# Altium footprint library Zmod.PcbLib: 229 footprints (part 10 of 15)
Each footprint in its own frame and in the unit in brackets; x right, y up, seen from the top. Pads: shape width x height; smd on the part's side, far side on the other; paste and mask are expansions set on the pad; w line width, h text height; cw(c..) or ccw(c..) is an arc to the next point about the centre after c.
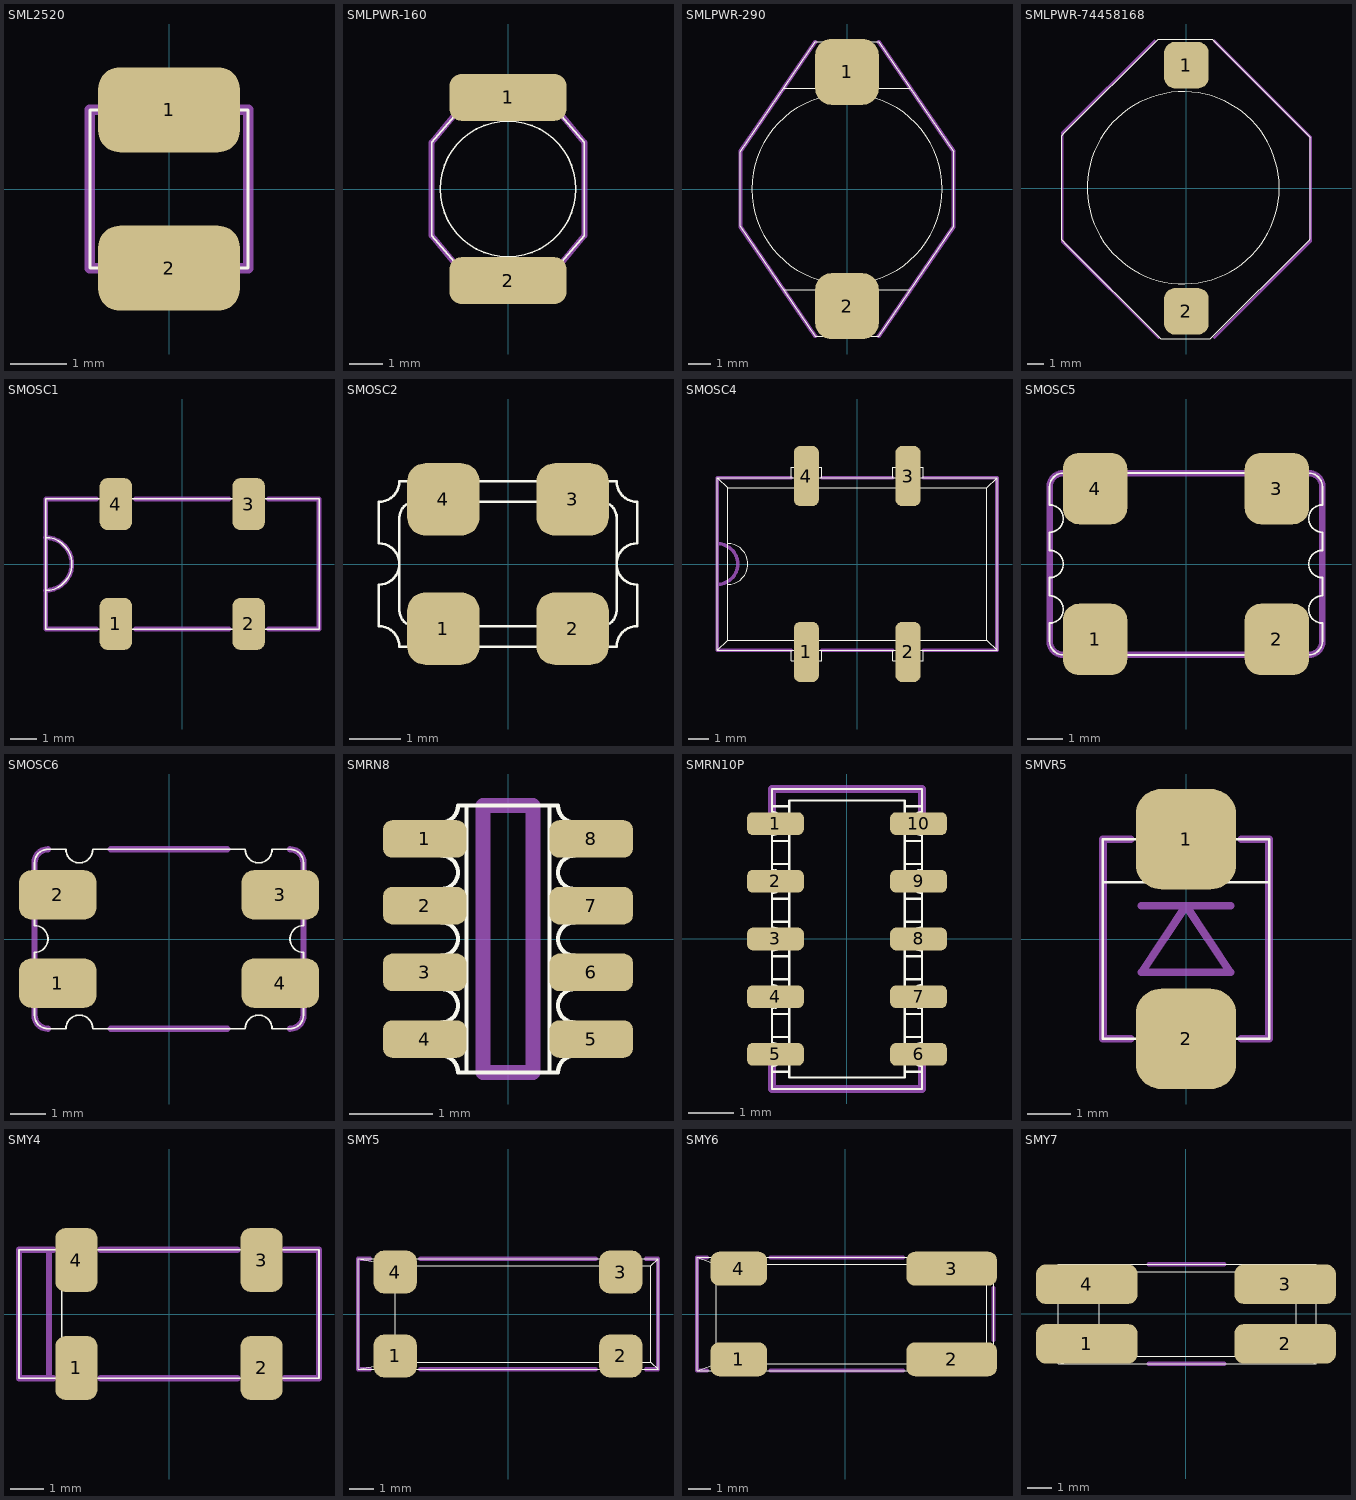
[diagram p9: the footprints below, top view; thin cyan lines are the x and y axes]

## SML2520 [mm]
height 2.032
pads (2):
  rrect50% 2.5x1.5 smd: 1(0,1.397) 2(0,-1.397)
Top Overlay:
  lines w0.05: -1.397,-1.397 1.397,-1.397 1.397,1.397 -1.397,1.397 -1.397,-1.397
Mechanical 15:
  lines w0.18: -1.27,-1.397 -1.397,-1.397 -1.397,1.397 -1.27,1.397 ; 1.27,-1.397 1.397,-1.397 1.397,1.397 1.27,1.397
  text ".Designator" at 0.635,-2.032 h1.5

## SMLPWR-160 [mm]
height 2.921
pads (2):
  rrect50% 3.5x1.4 smd: 1(0,2.743) 2(0,-2.743)
Top Overlay:
  circle w0.05: c0,0 r2.032
  circle w0.05: c0,0 r2.032
  lines w0.05: -1.524,-2.286 1.524,-2.286 ; -1.524,2.286 1.524,2.286 ; -2.286,-1.397 -0.635,-3.302 0.635,-3.302 2.286,-1.397 2.286,1.397 0.635,3.302 -0.635,3.302 -2.286,1.397 -2.286,-1.397
Mechanical 15:
  lines w0.18: -1.651,-2.159 -2.286,-1.397 -2.286,1.397 -1.651,2.159 ; 1.651,-2.159 2.286,-1.397 2.286,1.397 1.651,2.159
  text ".Designator" at 0.635,-3.302 h1.5

## SMLPWR-290 [mm]
height 5.207
pads (2):
  rrect50% 2.8x2.9 smd: 1(0,5.156) 2(0,-5.156)
Top Overlay:
  circle w0.05: c0,0 r4.191
  circle w0.05: c0,0 r4.191
  lines w0.05: -2.794,-4.445 2.794,-4.445 ; -2.794,4.445 2.794,4.445 ; -4.699,-1.651 -4.699,1.651 -1.397,6.477 1.397,6.477 4.699,1.651 4.699,-1.651 1.397,-6.477 -1.397,-6.477 -4.699,-1.651
Mechanical 15:
  lines w0.18: -1.397,-6.477 -4.699,-1.651 -4.699,1.651 -1.397,6.477 ; 1.397,-6.477 4.699,-1.651 4.699,1.651 1.397,6.477
  text ".Designator" at 0.254,-6.223 h1.5

## SMLPWR-74458168 [mm] "REV 1"
height 7.11
pads (2):
  rrect50% 2.79x2.92 smd: 1(0,7.685) 2(0,-7.685)
Top Overlay:
  circle w0.05: c-0.2,0.029 r6
  lines w0.05: 1.5,-9.415 1.499,-9.414 ; 1.499,-9.414 -1.601,-9.414 -7.501,-3.514 -7.8,-3.215 -7.8,3.185 -7.8,3.285 -7.6,3.485 -1.765,9.32 1.565,9.32 1.615,9.32 7.75,3.185 7.75,-3.163 7.665,-3.248 1.499,-9.414
Mechanical 15:
  lines w0.18: -2,9.185 -7.75,3.435 -7.75,-3.315 -1.75,-9.315 ; 1.75,-9.315 7.75,-3.315 7.75,3.185 1.75,9.185
  text ".Designator" at 0.254,-3.694 h1.5

## SMOSC1 [mm]
height 2.794
pads (4):
  rrect50% 1.25x2 smd: 1(-2.55,-2.3) 2(2.55,-2.3) 3(2.55,2.3) 4(-2.55,2.3)
Top Overlay:
  lines w0.05: -5.258,-1.016 ccw(c-5.258,0) -5.258,1.016 ; -2.8,-2.5 -2.8,-2.7 -2.3,-2.7 -2.3,-2.5 ; -2.8,2.5 -2.8,2.7 -2.3,2.7 -2.3,2.5 ; 2.3,-2.5 2.3,-2.7 2.8,-2.7 2.8,-2.5 ; 2.3,2.5 2.3,2.7 2.8,2.7 2.8,2.5 ; -5.25,-2.5 5.25,-2.5 5.25,2.5 -5.25,2.5 -5.25,-2.5
Mechanical 15:
  lines w0.18: -5.258,-1.016 ccw(c-5.258,0) -5.258,1.016 ; -3.3,-2.5 -5.25,-2.5 -5.25,2.5 -3.3,2.5 ; -1.8,-2.5 1.8,-2.5 ; -1.8,2.5 1.8,2.5 ; 3.3,-2.5 5.25,-2.5 5.25,2.5 3.3,2.5
  text ".Designator" at -5.207,0.762 h1.5

## SMOSC2 [mm]
height 1.016
pads (4):
  rrect50% 1.4x1.4 smd: 1(-1.25,-1.25) 2(1.25,-1.25) 3(1.25,1.25) 4(-1.25,1.25)
Top Overlay:
  lines w0.05: -1.85,1.2 1.8,1.2 cw(c1.8,0.9) 2.1,0.9 ; -1.8,1.2 ccw(c-1.8,0.9) -2.1,0.9 -2.1,-0.9 ccw(c-1.8,-0.9) -1.8,-1.2 1.8,-1.2 ccw(c1.8,-0.9) 2.1,-0.9 2.1,0.95 ; -2.5,-1.2 cw(c-2.5,-1.6) -2.1,-1.6 -1.65,-1.6 cw(c-1.25,-1.6) -0.85,-1.6 0.85,-1.6 cw(c1.25,-1.6) 1.65,-1.6 2.1,-1.6 cw(c2.5,-1.6) 2.5,-1.2 2.5,-0.4 cw(c2.5,0) 2.5,0.4 2.5,1.2 cw(c2.5,1.6) 2.1,1.6 1.65,1.6 cw(c1.25,1.6) 0.85,1.6 -0.85,1.6 cw(c-1.25,1.6) -1.65,1.6 -2.1,1.6 cw(c-2.5,1.6) -2.5,1.2 -2.5,0.4 cw(c-2.5,0) -2.5,-0.4 -2.5,-1.2
Mechanical 15:
  text ".Designator" at -2.032,0.254 h1.5

## SMOSC4 [mm]
height 4.699
pads (4):
  rrect50% 1.25x3 smd: 1(-2.54,-4.394) 2(2.54,-4.394) 3(2.54,4.394) 4(-2.54,4.394)
Mid-Layer 3:
  text "1" at -2.808,-4.14 h1.83
  text "4" at -3.244,2.083 h1.83
  text "3" at 1.88,2.083 h1.83
  text "2" at 1.88,-4.14 h1.83
Top Overlay:
  lines w0.05: -6.475,-1.016 ccw(c-6.477,0) -6.475,1.016 ; -3.302,-4.318 -3.302,-4.826 -1.778,-4.826 -1.778,-4.318 ; -3.302,4.318 -3.302,4.826 -1.778,4.826 -1.778,4.318 ; 1.778,-4.318 1.778,-4.826 3.302,-4.826 3.302,-4.318 ; 1.778,4.318 1.778,4.826 3.302,4.826 3.302,4.318 ; -6.985,-4.318 -6.477,-3.81 ; -6.985,-4.318 6.985,-4.318 ; -6.985,-4.318 -6.985,4.318 ; -6.985,4.318 -6.477,3.81 ; -6.985,4.318 6.985,4.318 ; -6.477,-3.81 -6.477,3.81 ; -6.477,-3.81 6.477,-3.81 ; -6.477,3.81 6.477,3.81 ; 6.477,-3.81 6.477,3.81 ; 6.477,-3.81 6.985,-4.318 ; 6.477,3.81 6.985,4.318 ; 6.985,-4.318 6.985,4.318
Mechanical 15:
  lines w0.18: -6.983,-1.016 ccw(c-6.985,0) -6.983,1.016 ; -3.302,-4.318 -6.985,-4.318 -6.985,4.318 -3.302,4.318 ; -1.778,-4.318 1.778,-4.318 ; -1.778,4.318 1.778,4.318 ; 3.302,-4.318 6.985,-4.318 6.985,4.318 3.302,4.318
  text ".Designator" at -5.588,1.27 h1.5

## SMOSC5 [mm]
height 1.524
pads (4):
  rrect50% 1.8x2 smd: 1(-2.54,-2.108) 2(2.54,-2.108) 3(2.54,2.108) 4(-2.54,2.108)
Top Overlay:
  lines w0.05: -3.81,-2.159 ccw(c-3.429,-2.159) -3.429,-2.54 -2.921,-2.54 cw(c-2.54,-2.54) -2.159,-2.54 2.159,-2.54 cw(c2.54,-2.54) 2.921,-2.54 3.429,-2.54 ccw(c3.429,-2.159) 3.81,-2.159 3.81,-1.651 cw(c3.81,-1.27) 3.81,-0.889 3.81,-0.381 cw(c3.81,0) 3.81,0.381 3.81,0.889 cw(c3.81,1.27) 3.81,1.651 3.81,2.159 ccw(c3.429,2.159) 3.429,2.54 2.921,2.54 cw(c2.54,2.54) 2.159,2.54 -2.159,2.54 cw(c-2.54,2.54) -2.921,2.54 -3.429,2.54 ccw(c-3.429,2.159) -3.81,2.159 -3.81,1.651 cw(c-3.81,1.27) -3.81,0.889 -3.81,0.381 cw(c-3.81,0) -3.81,-0.381 -3.81,-0.889 cw(c-3.81,-1.27) -3.81,-1.651 -3.81,-2.159
Mechanical 15:
  lines w0.18: -3.429,-2.54 cw(c-3.429,-2.159) -3.81,-2.159 -3.81,2.159 cw(c-3.429,2.159) -3.429,2.54 ; -1.651,-2.54 1.651,-2.54 ; -1.651,2.54 1.651,2.54 ; 3.429,-2.54 ccw(c3.429,-2.159) 3.81,-2.159 3.81,2.159 ccw(c3.429,2.159) 3.429,2.54
  text ".Designator" at -3.175,0 h1.5

## SMOSC6 [mm] "Rev.1"
height 1.4
pads (4):
  rrect50% 2.2x1.4 smd: 1(-3.15,-1.25) 2(-3.15,1.25) 3(3.15,1.25) 4(3.15,-1.25)
Top Overlay:
  lines w0.05: -3.81,-2.159 ccw(c-3.429,-2.159) -3.429,-2.54 -2.921,-2.54 cw(c-2.54,-2.54) -2.159,-2.54 2.159,-2.54 cw(c2.54,-2.54) 2.921,-2.54 3.429,-2.54 ccw(c3.429,-2.159) 3.81,-2.159 3.81,-1.651 cw(c3.81,-1.27) 3.81,-0.889 3.81,-0.381 cw(c3.81,0) 3.81,0.381 3.81,0.889 cw(c3.81,1.27) 3.81,1.651 3.81,2.159 ccw(c3.429,2.159) 3.429,2.54 2.921,2.54 cw(c2.54,2.54) 2.159,2.54 -2.159,2.54 cw(c-2.54,2.54) -2.921,2.54 -3.429,2.54 ccw(c-3.429,2.159) -3.81,2.159 -3.81,1.651 cw(c-3.81,1.27) -3.81,0.889 -3.81,0.381 cw(c-3.81,0) -3.81,-0.381 -3.81,-0.889 cw(c-3.81,-1.27) -3.81,-1.651 -3.81,-2.159
Mechanical 15:
  lines w0.18: -3.429,-2.54 cw(c-3.429,-2.159) -3.81,-2.159 -3.81,2.159 cw(c-3.429,2.159) -3.429,2.54 ; -1.651,-2.54 1.651,-2.54 ; -1.651,2.54 1.651,2.54 ; 3.429,-2.54 ccw(c3.429,-2.159) 3.81,-2.159 3.81,2.159 ccw(c3.429,2.159) 3.429,2.54
  text ".Designator" at -3.375,-0.4 h1.5

## SMRN8 [mm]
height 0.5
pads (8):
  rrect50% 1x0.45 smd paste+0: 1(-1,1.2) 2(-1,0.4) 3(-1,-0.4) 4(-1,-1.2) 5(1,-1.2) 6(1,-0.4) 7(1,0.4) 8(1,1.2)
Top Overlay:
  lines w0.05: -0.5,-1.6 -0.5,1.6 ; 0.5,-1.6 0.5,1.6 ; -0.8,-1.4 cw(c-0.8,-1.6) -0.6,-1.6 0.6,-1.6 cw(c0.8,-1.6) 0.8,-1.4 0.8,-1 cw(c0.8,-0.8) 0.8,-0.6 0.8,-0.2 cw(c0.8,0) 0.8,0.2 0.8,0.6 cw(c0.8,0.8) 0.8,1 0.8,1.4 cw(c0.8,1.6) 0.6,1.6 -0.6,1.6 cw(c-0.8,1.6) -0.8,1.4 -0.8,1 cw(c-0.8,0.8) -0.8,0.6 -0.8,0.2 cw(c-0.8,0) -0.8,-0.2 -0.8,-0.6 cw(c-0.8,-0.8) -0.8,-1 -0.8,-1.4
Mechanical 15:
  lines w0.18: -0.3,-1.6 -0.3,1.6 0.3,1.6 0.3,-1.6 -0.3,-1.6
  text ".Designator" at 0.6,-2.1 h1.5

## SMRN10P [mm]
height 0.635
pads (10):
  rrect50% 1.25x0.5 smd paste+0: 1(-1.575,2.54) 2(-1.575,1.27) 3(-1.575,0) 4(-1.575,-1.27) 5(-1.575,-2.54) 6(1.575,-2.54) 7(1.575,-1.27) 8(1.575,0) 9(1.575,1.27) 10(1.575,2.54)
Top Overlay:
  lines w0.05: -1.651,-2.921 -1.27,-2.921 ; -1.651,-2.794 -1.651,-3.302 1.651,-3.302 1.651,-2.794 ; -1.651,-2.286 -1.651,-1.524 ; -1.651,-2.159 -1.27,-2.159 ; -1.651,-1.651 -1.27,-1.651 ; -1.651,-1.016 -1.651,-0.254 ; -1.651,-0.889 -1.27,-0.889 ; -1.651,-0.381 -1.27,-0.381 ; -1.651,0.254 -1.651,1.016 ; -1.651,0.381 -1.27,0.381 ; -1.651,0.889 -1.27,0.889 ; -1.651,1.524 -1.651,2.286 ; -1.651,1.651 -1.27,1.651 ; -1.651,2.159 -1.27,2.159 ; -1.651,2.794 -1.651,3.302 1.651,3.302 1.651,2.794 ; -1.651,2.921 -1.27,2.921 ; 1.27,-2.921 1.651,-2.921 ; 1.27,-2.159 1.651,-2.159 ; 1.27,-1.651 1.651,-1.651 ; 1.27,-0.889 1.651,-0.889 ; 1.27,-0.381 1.651,-0.381 ; 1.27,0.381 1.651,0.381 ; 1.27,0.889 1.651,0.889 ; 1.27,1.651 1.651,1.651 ; 1.27,2.159 1.651,2.159 ; 1.27,2.921 1.651,2.921 ; 1.651,-2.286 1.651,-1.524 ; 1.651,-1.016 1.651,-0.254 ; 1.651,0.254 1.651,1.016 ; 1.651,1.524 1.651,2.286 ; -1.27,-3.048 1.27,-3.048 1.27,3.048 -1.27,3.048 -1.27,-3.048
  lines w0.051: -1.651,-2.794 ccw(c-1.651,-2.54) -1.651,-2.286 ; -1.651,-1.524 ccw(c-1.651,-1.27) -1.651,-1.016 ; -1.651,-0.254 ccw(c-1.651,0) -1.651,0.254 ; -1.651,1.016 ccw(c-1.651,1.27) -1.651,1.524 ; -1.651,2.286 ccw(c-1.651,2.54) -1.651,2.794 ; 1.651,-2.794 cw(c1.651,-2.54) 1.651,-2.286 ; 1.651,-1.524 cw(c1.651,-1.27) 1.651,-1.016 ; 1.651,-0.254 cw(c1.651,0) 1.651,0.254 ; 1.651,1.016 cw(c1.651,1.27) 1.651,1.524 ; 1.651,2.286 cw(c1.651,2.54) 1.651,2.794
Mechanical 15:
  lines w0.18: -1.651,-2.794 -1.651,-3.302 1.651,-3.302 1.651,-2.794 ; -1.651,2.794 -1.651,3.302 1.651,3.302 1.651,2.794
  text ".Designator" at -0.381,-3.81 h1.5

## SMVR5 [mm]
height 2.54
pads (2):
  rrect50% 2.3x2.3 smd: 1(0,2.286) 2(0,-2.286)
Top Overlay:
  lines w0.05: -1.9,1.3 1.9,1.3 ; -1.016,-2.286 -1.016,-2.794 1.016,-2.794 1.016,-2.286 ; -1.016,2.286 -1.016,2.794 1.016,2.794 1.016,2.286 ; -1.905,-2.286 -1.905,2.286 1.905,2.286 1.905,-2.286 -1.905,-2.286
Mechanical 15:
  lines w0.18: -1.27,-2.286 -1.905,-2.286 -1.905,2.286 -1.27,2.286 ; -1.016,0.762 1.016,0.762 ; 1.27,-2.286 1.905,-2.286 1.905,2.286 1.27,2.286 ; -1.016,-0.762 0,0.762 1.016,-0.762 -1.016,-0.762
  text ".Designator" at 0.254,-2.413 h1.5

## SMY4 [mm]
height 2.54
pads (4):
  rrect50% 1.25x1.9 smd: 1(-2.743,-1.6) 2(2.743,-1.6) 3(2.743,1.6) 4(-2.743,1.6)
Mid-Layer 3:
  text "1" at -2.935,-2.235 h1.83
  text "4" at -3.371,0.305 h1.83
  text "3" at 2.134,0.305 h1.83
  text "2" at 2.134,-2.235 h1.83
Top Overlay:
  lines w0.05: -3.175,-1.905 -3.175,1.905 ; -2.997,-1.905 -2.997,-2.032 -2.489,-2.032 -2.489,-1.905 ; -2.997,1.905 -2.997,2.032 -2.489,2.032 -2.489,1.905 ; 2.489,-1.905 2.489,-2.032 2.997,-2.032 2.997,-1.905 ; 2.489,1.905 2.489,2.032 2.997,2.032 2.997,1.905 ; -4.445,-1.905 -4.445,1.905 4.445,1.905 4.445,-1.905 -4.445,-1.905
Mechanical 15:
  lines w0.18: -3.556,-1.905 -3.556,1.905 ; -3.429,-1.905 -4.445,-1.905 -4.445,1.905 -3.429,1.905 ; -2.032,-1.905 2.032,-1.905 ; -2.032,1.905 2.032,1.905 ; 3.429,-1.905 4.445,-1.905 4.445,1.905 3.429,1.905
  text ".Designator" at -3.302,0.127 h1.5

## SMY5 [mm]
height 3.81
pads (4):
  rrect50% 1.8x1.8 smd: 1(-4.7,-1.75) 2(4.7,-1.75) 3(4.7,1.75) 4(-4.7,1.75)
Top Overlay:
  lines w0.05: -6.25,-2.3 -6.25,2.3 ; -6.25,-2.3 -4.7,-2 ; -6.25,-2.3 6.25,-2.3 ; -6.25,2.3 -4.7,2 ; -6.25,2.3 6.25,2.3 ; -4.7,-2 -4.7,2 ; -4.7,-2 5.95,-2 ; -4.7,2 5.95,2 ; 5.95,-2 5.95,2 ; 5.95,-2 6.25,-2.3 ; 5.95,2 6.25,2.3 ; 6.25,-2.3 6.25,2.3
Mechanical 15:
  lines w0.18: -5.75,-2.3 -6.25,-2.3 -6.25,2.3 -5.75,2.3 ; -3.65,-2.3 3.65,-2.3 ; -3.65,2.3 3.65,2.3 ; 5.75,-2.3 6.25,-2.3 6.25,2.3 5.75,2.3
  text ".Designator" at -4.445,0.381 h1.5

## SMY6 [mm]
height 5.08
pads (4):
  rrect50% 2.5x1.5 smd: 1(-4.7,-2) 4(-4.7,2)
  rrect50% 4x1.5 smd: 2(4.7,-2) 3(4.7,2)
Top Overlay:
  lines w0.05: -5.6,-2.5 -5.6,-2.65 -3.8,-2.65 -3.8,-2.5 ; -5.6,2.5 -5.6,2.65 -3.8,2.65 -3.8,2.5 ; 3.2,-2.5 3.2,-2.65 6.2,-2.65 6.2,-2.5 ; 3.2,2.5 3.2,2.65 6.2,2.65 6.2,2.5 ; -6.55,-2.5 -6.55,2.5 ; -6.55,-2.5 -5.7,-2.2 ; -6.55,-2.5 6.55,-2.5 ; -6.55,2.5 -5.7,2.2 ; -6.55,2.5 6.55,2.5 ; -5.7,-2.2 -5.7,2.2 ; -5.7,-2.2 6.25,-2.2 ; -5.7,2.2 6.25,2.2 ; 6.25,-2.2 6.25,2.2 ; 6.25,-2.2 6.55,-2.5 ; 6.25,2.2 6.55,2.5 ; 6.55,-2.5 6.55,2.5
Mechanical 15:
  lines w0.18: -6.1,-2.5 -6.55,-2.5 -6.55,2.5 -6.1,2.5 ; -3.3,-2.5 2.55,-2.5 ; -3.3,2.5 2.55,2.5 ; 6.55,-1.15 6.55,1.15
  text ".Designator" at -5.461,0.254 h1.5

## SMY7 [mm] "IQD A103D, 90SMX, 91SMX. Rev. 1"
height 3.4
pads (4):
  rrect50% 4.1x1.6 smd: 1(-4,-1.2) 2(4,-1.2) 3(4,1.2) 4(-4,1.2)
Top Overlay:
  lines w0.05: -5.15,-2 -5.15,2 ; -5.15,-2 -3.5,-1.7 ; -5.15,-2 5.25,-2 ; -5.15,2 5.25,2 ; -5.15,2 -3.5,1.7 ; -3.5,-1.7 -3.5,1.7 ; -3.5,-1.7 4.45,-1.7 ; -3.5,1.7 4.45,1.7 ; 4.45,-1.7 4.45,1.7 ; 4.45,-1.7 5.25,-2 ; 4.45,1.7 5.25,2 ; 5.25,-2 5.25,2
Mechanical 15:
  lines w0.18: -1.5,-2 1.55,-2 ; -1.5,2 1.55,2
  text ".Designator" at -5.161,-0.446 h1.5